# Altium footprint library USB_PD_PSU.PcbLib: 47 footprints (part 3 of 3)
Each footprint in its own frame and in the unit in brackets; x right, y up, seen from the top. Pads: shape width x height; smd on the part's side, far side on the other; paste and mask are expansions set on the pad; w line width, h text height; cw(c..) or ccw(c..) is an arc to the next point about the centre after c.
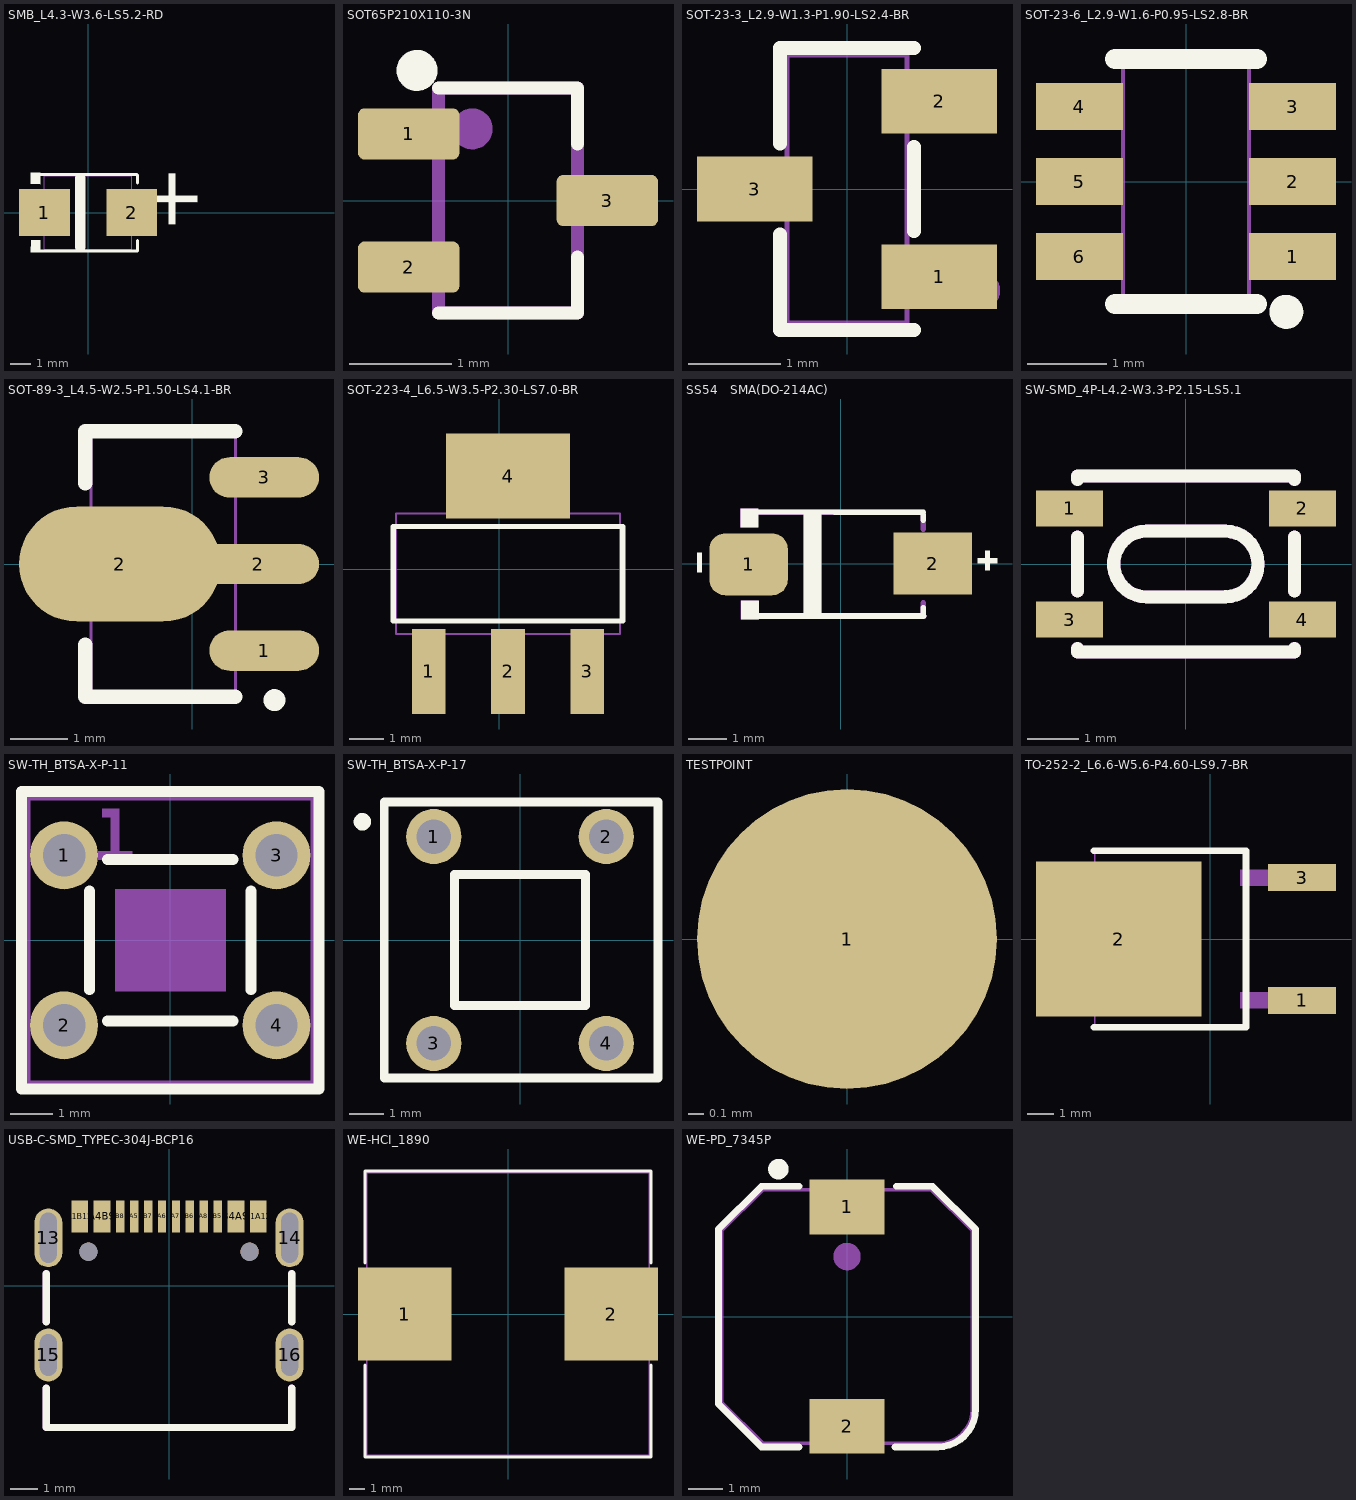
[diagram p2: the footprints below, top view; thin cyan lines are the x and y axes]

## SMB_L4.3-W3.6-LS5.2-RD [mm]
pads (2):
  rect 2.5x2.3 smd: 1(-2.15,0) 2(2.15,0)
Top Overlay:
  region: -2.357,-1.962 -2.344,-1.37 -2.804,-1.364 -2.814,-1.962
  region: -2.353,1.949 -2.365,1.399 -2.81,1.405 -2.81,1.949
  lines w0.152: -2.744,-1.886 2.433,-1.88 ; -2.744,1.886 2.413,1.88 ; 2.424,-1.877 2.431,-1.381 ; 2.424,1.839 2.427,1.462
  lines w0.508: -0.381,-1.682 -0.381,1.683
  text "+" at 6.36,-1.016 h5
  text "-" at -2.846,-0.721 h5
Top Assembly:
  region: 1.457,1.042 2.597,1.042 2.597,-1.042 1.457,-1.042
  region: -1.461,-1.042 -2.601,-1.042 -2.601,1.042 -1.461,1.042
  lines w0.051: -2.158,-1.81 2.158,-1.81 2.158,1.81 -2.158,1.81 -2.158,-1.81
  text ".Designator" at -2.413,2.221 h1
Mechanical 6:
  region: 2.487,-0.98 2.487,0.83 2.216,0.83 2.216,-0.98
  region: 2.895,-0.108 2.895,0.164 1.809,0.164 1.809,-0.108
  region: -2.801,-0.126 -2.801,0.145 -1.715,0.145 -1.715,-0.126
Mechanical 15:
  region: -2.587,-1.81 -2.587,-1.835 -2.623,-1.87 -2.672,-1.87 -2.707,-1.835 -2.707,-1.81 -2.707,-1.785 -2.672,-1.75 -2.623,-1.75 -2.587,-1.785 -2.587,-1.81
3D body "SMB (DO-214AA).STEP": height 2.5, standoff 0, extent -2.827,-1.95 2.573,1.95

## SOT65P210X110-3N [mm]
pads (3):
  rrect25% 0.99x0.5 smd: 1(-0.97,0.65) 2(-0.97,-0.65) 3(0.97,0)
Top Overlay:
  circle w0.2: c-0.889,1.27 r0.1
  lines w0.127: -0.68,-1.1 0.68,-1.1 0.68,-0.55 ; -0.68,1.1 0.68,1.1 0.68,0.55
Top Assembly:
  circle w0.2: c-0.35,0.7 r0.1
  lines w0.127: -0.68,-1.1 0.68,-1.1 0.68,1.1 -0.68,1.1 -0.68,-1.1
3D body "step_temp.STEP": height 1.1, standoff 0, extent -1.05,-1 1.05,1

## SOT-23-3_L2.9-W1.3-P1.90-LS2.4-BR [mm]
pads (3):
  rect 1.25x0.7 smd: 1(1,-0.95) 2(1,0.95) 3(-1,0)
Top Overlay:
  lines w0.152: -0.726,-0.495 -0.726,-1.526 0.726,-1.526 ; -0.726,0.495 -0.726,1.526 0.726,1.526 ; 0.726,-0.455 0.726,0.455
Top Assembly:
  region: 0.64,0.735 0.64,1.165 0.91,1.165 0.91,0.735
  region: -0.91,-0.215 -0.91,0.215 -0.64,0.215 -0.64,-0.215
  region: -1.2,-0.215 -1.2,0.215 -0.9,0.215 -0.9,-0.215
  region: 0.64,-1.165 0.64,-0.735 0.91,-0.735 0.91,-1.165
  region: 0.9,0.735 0.9,1.165 1.2,1.165 1.2,0.735
  region: 0.9,-1.165 0.9,-0.735 1.2,-0.735 1.2,-1.165
  lines w0.051: -0.65,-1.45 -0.65,1.45 0.65,1.45 0.65,-1.45 -0.65,-1.45
  text ".Designator" at 0.171,-1.02 h0.5
Mechanical 6:
  circle w0.2: c1.46,-1.1 r0.1
3D body "SOT23-3.step": height 1.1, standoff 0, extent -1.25,-1.499 1.25,1.499

## SOT-23-6_L2.9-W1.6-P0.95-LS2.8-BR [mm]
pads (6):
  rect 1.1x0.6 smd paste+0 mask+0.051: 1(1.35,-0.95) 2(1.35,0) 3(1.35,0.95) 4(-1.35,0.95) 5(-1.35,0) 6(-1.35,-0.95)
Top Overlay:
  circle w0.254: c1.27,-1.651 r0.089
  lines w0.254: -0.9,-1.55 0.9,-1.55 ; -0.9,1.55 0.9,1.55
Top Assembly:
  region: 1.33,-1.584 1.33,-1.609 1.295,-1.644 1.245,-1.644 1.21,-1.609 1.21,-1.584 1.21,-1.559 1.245,-1.524 1.295,-1.524 1.33,-1.559 1.33,-1.584
  region: -0.935,0.735 -0.935,1.165 -0.79,1.165 -0.79,0.735
  region: -0.935,-1.165 -0.935,-0.735 -0.79,-0.735 -0.79,-1.165
  region: 0.935,-0.735 0.935,-1.165 0.79,-1.165 0.79,-0.735
  region: 0.925,0.735 0.925,1.165 1.4,1.165 1.4,0.735
  region: 0.925,-0.215 0.925,0.215 1.4,0.215 1.4,-0.215
  region: 0.935,0.215 0.935,-0.215 0.79,-0.215 0.79,0.215
  region: -0.925,-1.165 -0.925,-0.735 -1.4,-0.735 -1.4,-1.165
  region: 0.935,1.165 0.935,0.735 0.79,0.735 0.79,1.165
  region: -0.925,-0.215 -0.925,0.215 -1.4,0.215 -1.4,-0.215
  region: 0.925,-1.165 0.925,-0.735 1.4,-0.735 1.4,-1.165
  region: -0.935,-0.215 -0.935,0.215 -0.79,0.215 -0.79,-0.215
  region: -0.925,0.735 -0.925,1.165 -1.4,1.165 -1.4,0.735
  lines w0.051: -0.8,-1.45 0.8,-1.45 0.8,1.45 -0.8,1.45 -0.8,-1.45
  text ".Designator" at 0.16,-1.27 h0.5
Mechanical 6:
  circle w0.2: c1.4,-0.95 r0.1
3D body "User Library-TSOT-23-6(S6).x_t": height 1, standoff 0, extent -1.412,-1.45 1.412,1.45

## SOT-89-3_L4.5-W2.5-P1.50-LS4.1-BR [mm]
pads (4):
  oval 1.9x0.7 smd paste-100 mask+0.051: 1(1.25,-1.501) 3(1.25,1.501)
  oval 3.5x2 smd paste-100 mask+0.051: 2(-1.25,0)
  oval 2.1x0.7 smd paste-100 mask+0.051: 2(1.151,0)
Top Overlay:
  circle w0.254: c1.429,-2.36 r0.062
  lines w0.254: -1.85,-1.4 -1.85,-2.3 0.75,-2.3 ; -1.85,1.4 -1.85,2.3 0.75,2.3
Top Paste:
  drawing of 3 lines, arcs and shapes, not listed
Top Assembly:
  region: 1.524,-2.388 1.524,-2.413 1.489,-2.448 1.439,-2.448 1.404,-2.413 1.404,-2.388 1.404,-2.363 1.439,-2.328 1.489,-2.328 1.524,-2.363 1.524,-2.388
  region: 0.65,-1.294 0.65,-1.709 1.85,-1.709 1.85,-1.294
  region: 0.65,1.709 0.65,1.294 1.85,1.294 1.85,1.709
  region: 0.551,0.233 0.551,-0.233 1.85,-0.233 1.85,0.233
  region: -1.949,-0.8 -2.25,-0.499 -2.247,0.5 -1.943,0.8 -0.024,0.8 0.551,0.23 0.551,-0.23 -0.126,-0.8
  lines w0.051: -1.75,-2.25 -1.75,2.25 0.75,2.25 0.75,-2.25 -1.75,-2.25
  text ".Designator" at -0.242,-2.195 h1
Mechanical 6:
  circle w0.254: c1.455,-1.575 r0.127
3D body "ams1117.step": height 1.52, standoff 0, extent -2.127,-2.25 1.873,2.25

## SOT-223-4_L6.5-W3.5-P2.30-LS7.0-BR [mm]
pads (4):
  rect 0.98x2.47 smd: 1(-2.046,-2.962) 2(0.254,-2.962) 3(2.554,-2.962)
  rect 3.6x2.47 smd: 4(0.254,2.708)
Top Overlay:
  lines w0.152: -3.072,-1.498 3.58,-1.498 3.58,1.244 -3.072,1.244 -3.072,-1.498
Top Assembly:
  region: -2.396,-1.867 -1.696,-1.867 -1.696,-2.687 -2.396,-2.687
  region: 2.204,-2.677 2.904,-2.677 2.904,-3.627 2.204,-3.627
  region: 2.204,-1.867 2.904,-1.867 2.904,-2.687 2.204,-2.687
  region: -1.246,2.423 1.754,2.423 1.754,3.373 -1.246,3.373
  region: -1.246,2.433 1.754,2.433 1.754,1.613 -1.246,1.613
  region: -0.096,-2.677 0.604,-2.677 0.604,-3.627 -0.096,-3.627
  region: -0.096,-1.867 0.604,-1.867 0.604,-2.687 -0.096,-2.687
  region: -2.396,-2.677 -1.696,-2.677 -1.696,-3.627 -2.396,-3.627
  lines w0.051: -2.996,-1.877 3.504,-1.877 3.504,1.623 -2.996,1.623 -2.996,-1.877
  text ".Designator" at -2.322,-0.393 h1
3D body "CircuitWorks-SOT-223.x_t": height 1.7, standoff 0.02, extent -2.996,-3.607 3.504,3.353

## SS54   SMA(DO-214AC) [mm]
pads (2):
  rrect50% 2.046x1.62 smd: 1(-2.404,-0.009)
  rect 2.046x1.62 smd: 2(2.404,0.009)
Top Overlay:
  region: -0.961,-1.397 -0.961,1.397 -0.508,1.397 -0.508,-1.397
  region: 3.773,-0.169 3.773,0.339 3.9,0.339 3.9,-0.169
  region: 3.575,0.143 4.083,0.143 4.083,0.016 3.575,0.016
  region: -3.752,-0.213 -3.752,0.295 -3.625,0.295 -3.625,-0.213
  region: -2.158,1.44 -2.158,0.962 -2.615,0.962 -2.615,1.44
  region: -2.145,-1.44 -2.145,-0.962 -2.602,-0.962 -2.602,-1.44
  lines w0.152: -2.526,1.364 2.159,1.346 ; -2.503,-1.364 2.165,-1.364 ; 2.159,-1.364 2.159,-1.143 ; 2.159,1.143 2.159,1.27
Top Assembly:
  region: -0.963,-1.402 -0.963,1.392 -0.51,1.392 -0.51,-1.402
  region: 1.846,0.227 2.354,0.227 2.354,0.1 1.846,0.1
  region: -2.8,-0.254 -2.8,0.254 -2.673,0.254 -2.673,-0.254
  region: -2.159,1.435 -2.159,0.958 -2.617,0.958 -2.617,1.435
  region: -2.147,-1.445 -2.147,-0.967 -2.604,-0.967 -2.604,-1.445
  region: 2.044,-0.085 2.044,0.423 2.171,0.423 2.171,-0.085
  region: -2.432,-0.097 -2.432,0.097 -1.659,0.097 -1.659,-0.097
  region: 2.432,-0.097 2.432,0.097 1.659,0.097 1.659,-0.097
  region: 2.142,-0.644 2.142,0.644 1.949,0.644 1.949,-0.644
  lines w0.152: -2.528,1.359 2.157,1.341 ; -2.505,-1.369 2.163,-1.369 ; 2.157,-1.369 2.157,-1.018 ; 2.157,0.915 2.157,1.265
  text "'.Designator'" at -0.762,-0.127 h0.5
3D body "SMA (DO-214AC).STEP": height 2.3, standoff 0, extent -2.854,-1.45 2.346,1.45

## SW-SMD_4P-L4.2-W3.3-P2.15-LS5.1 [mm]
pads (4):
  rect 1.3x0.7 smd paste+0 mask+0.051: 1(-2.25,1.075) 2(2.25,1.075) 3(-2.25,-1.075) 4(2.25,-1.075)
Top Overlay:
  lines w0.254: -2.1,-1.631 -2.1,-1.7 2.1,-1.7 2.1,-1.631 ; -2.1,-0.519 -2.1,0.519 ; -2.1,1.631 -2.1,1.7 2.1,1.7 2.1,1.631 ; -0.763,0.636 ccw(c-0.763,0) -0.762,-0.635 0.762,-0.635 ; -0.762,0.635 0.762,0.635 cw(c0.757,0) 0.761,-0.634 ; 2.1,-0.519 2.1,0.519
Top Assembly:
  lines w0.254: -2.1,-1.631 -2.1,-1.7 2.1,-1.7 2.1,-1.631 ; -2.1,-0.519 -2.1,0.519 ; -2.1,1.631 -2.1,1.7 2.1,1.7 2.1,1.631 ; -0.763,0.636 ccw(c-0.763,0) -0.762,-0.635 0.762,-0.635 ; -0.762,0.635 0.762,0.635 cw(c0.757,0) 0.761,-0.634 ; 2.1,-0.519 2.1,0.519
  text ".Designator" at -0.256,-0.016 h1
3D body "PTS810 SJM 250 SMTR LFS--3DModel-STEP-56544.STEP": height 2.7, standoff 0, extent -2.3,-1.6 2.3,1.6

## SW-TH_BTSA-X-P-11 [mm]
pads (4):
  round 1.6 hole 1: 1(-2.5,2) 2(-2.5,-2) 3(2.5,2) 4(2.5,-2)
Top Overlay:
  lines w0.254: -1.9,-1.162 -1.9,1.162 ; -1.474,-1.9 1.474,-1.9 ; -1.474,1.9 1.474,1.9 ; 1.9,-1.162 1.9,1.162 ; -3.5,-3.5 -3.5,3.5 3.5,3.5 3.5,-3.5 -3.5,-3.5
Top Assembly:
  region: -3.5,3.5 -3.5,-3.5 -3.3,-3.5 -3.3,3.5
  region: -3.3,3.5 3.5,3.5 3.5,-3.5 3.3,-3.5 3.3,3.3 -3.3,3.3
  region: -3.3,-3.5 3.3,-3.5 3.3,-3.3 -3.3,-3.3
  region: -1.4,3.1 -1.6,3.1 -1.6,2.9 -1.4,2.9
  region: -1.7,2.1 -0.9,2.1 -0.9,1.9 -1.7,1.9
  region: -1.4,3.1 -1.4,2.1 -1.2,2.1 -1.2,3.1
  region: -1.3,1.2 1.3,1.2 1.3,-1.2 -1.3,-1.2
Mechanical 15:
  region: 2.35,1.7 2.35,2.3 2.65,2.3 2.65,1.7
  region: 2.35,-2.3 2.35,-1.7 2.65,-1.7 2.65,-2.3
  region: -2.65,-2.3 -2.65,-1.7 -2.35,-1.7 -2.35,-2.3
  region: -2.65,1.7 -2.65,2.3 -2.35,2.3 -2.35,1.7
  region: -3.44,3.5 -3.44,3.475 -3.475,3.44 -3.525,3.44 -3.56,3.475 -3.56,3.5 -3.56,3.525 -3.525,3.56 -3.475,3.56 -3.44,3.525 -3.44,3.5
  lines w0.051: -3.5,-3.5 -3.5,3.5 3.5,3.5 3.5,-3.5 -3.5,-3.5
3D body "PVA1EEH1--3DModel-STEP-56544.STEP": height 17.84, standoff -3.4, extent -4.6,-4.773 4.6,5.027

## SW-TH_BTSA-X-P-17 [mm]
pads (4):
  round 1.6 hole 1: 1(-2.5,3) 2(2.5,3) 3(-2.5,-3) 4(2.5,-3)
Top Overlay:
  circle w0.254: c-4.572,3.429 r0.127
  lines w0.254: -3.937,-4 4,-4 4,4 -3.937,4 -3.937,-4 ; -1.9,-1.9 -1.9,1.9 1.9,1.9 1.9,-1.9 -1.9,-1.9
Top Assembly:
  region: -3.94,4 -3.94,3.975 -3.975,3.94 -4.025,3.94 -4.06,3.975 -4.06,4 -4.06,4.025 -4.025,4.06 -3.975,4.06 -3.94,4.025 -3.94,4
  lines w0.051: -4,-4 -4,4 4,4 4,-4 -4,-4
  text ".Designator" at -2.329,-0.173 h1
Mechanical 15:
  region: -2.2,-3.15 -2.8,-3.15 -2.8,-2.85 -2.2,-2.85
  region: 2.8,-3.15 2.2,-3.15 2.2,-2.85 2.8,-2.85
  region: 2.8,2.85 2.2,2.85 2.2,3.15 2.8,3.15
  region: -2.8,3.15 -2.2,3.15 -2.2,2.85 -2.8,2.85
3D body "PVA1EEH1--3DModel-STEP-56544.STEP": height 17.84, standoff -3.4, extent -4.9,-4.727 4.9,4.473

## TESTPOINT [mm]
pads (1):
  round 2 smd: 1(0,0)

## TO-252-2_L6.6-W5.6-P4.60-LS9.7-BR [mm]
pads (3):
  rect 2.54x1 smd: 1(3.427,-2.3) 3(3.427,2.3)
  rect 6.2x5.8 smd: 2(-3.427,0)
Top Overlay:
  lines w0.254: -4.365,-3.3 1.335,-3.3 1.335,3.3 -4.365,3.3
Top Assembly:
  region: 1.115,2.6 2.715,2.6 2.715,2 1.115,2
  region: 2.677,2.6 3.877,2.6 3.877,2 2.677,2
  region: 2.677,-2 3.877,-2 3.877,-2.6 2.677,-2.6
  region: -5.527,2.7 -0.812,2.7 -0.812,-2.7 -5.527,-2.7 -5.827,-2.413 -5.827,-1.505 -5.827,1.505 -5.827,2.413
  region: 1.115,-2 2.715,-2 2.715,-2.6 1.115,-2.6
  lines w0.051: -4.327,-3.3 1.273,-3.3 1.273,3.3 -4.327,3.3 -4.327,-3.3
  text ".Designator" at 0.7,-2.159 h1
Mechanical 6:
  circle w0.4: c4.235,-2.3 r0.2
3D body "FFSD1065B-F085.STEP": height 2.32, standoff 0, extent -6.075,-3.366 4.318,3.366

## USB-C-SMD_TYPEC-304J-BCP16 [mm]
pads (18):
  oval 1x2.1 hole 0.6 slot 1.8 at 90 deg paste-2539.97 mask+0.051: 13(-4.325,1.719) 14(4.325,1.719)
  oval 1x1.9 hole 0.6 slot 1.5 at 90 deg paste-2539.97 mask+0.051: 15(-4.325,-2.481) 16(4.325,-2.481)
  rect 0.6x1.15 smd mask+0.04: A1B12(-3.2,2.481) A4B9(-2.4,2.481) B1A12(3.2,2.481) B4A9(2.4,2.481)
  rect 0.3x1.15 smd mask+0.04: A5(-1.25,2.481) A6(-0.25,2.481) A7(0.25,2.481) A8(1.25,2.481) B5(1.75,2.481) B6(0.75,2.481) B7(-0.75,2.481) B8(-1.75,2.481)
  round 0.65 hole 0.65 unplated paste-2539.97: ""(-2.89,1.219) ""(2.89,1.219)
Top Overlay:
  lines w0.254: -4.4,-3.659 -4.4,-5.081 4.4,-5.081 4.4,-3.659 ; -4.4,-1.304 -4.4,0.441 ; 4.4,-1.304 4.4,0.441
Top Paste:
  region: -3.5,3.056 -2.9,3.056 -2.9,1.906 -3.5,1.906
  region: -2.7,3.056 -2.1,3.056 -2.1,1.906 -2.7,1.906
  region: -1.9,3.056 -1.6,3.056 -1.6,1.906 -1.9,1.906
  region: -1.4,3.056 -1.1,3.056 -1.1,1.906 -1.4,1.906
  region: -0.9,3.056 -0.6,3.056 -0.6,1.906 -0.9,1.906
  region: -0.4,3.056 -0.1,3.056 -0.1,1.906 -0.4,1.906
  region: 0.1,3.056 0.4,3.056 0.4,1.906 0.1,1.906
  region: 0.6,3.056 0.9,3.056 0.9,1.906 0.6,1.906
  region: 1.1,3.056 1.4,3.056 1.4,1.906 1.1,1.906
  region: 1.6,3.056 1.9,3.056 1.9,1.906 1.6,1.906
  region: 2.1,3.056 2.7,3.056 2.7,1.906 2.1,1.906
  region: 2.9,3.056 3.5,3.056 3.5,1.906 2.9,1.906
  region: -4.825,2.269 -4.825,2.368 -4.749,2.552 -4.608,2.692 -4.424,2.769 -4.226,2.769 -4.042,2.692 -3.901,2.552 -3.825,2.368 -3.825,2.269 -3.825,1.169 -3.825,1.069 -3.901,0.885 -4.042,0.745 -4.226,0.669 -4.424,0.669 -4.608,0.745 -4.749,0.885 -4.825,1.069 -4.825,1.169
  region: 3.825,2.269 3.825,2.368 3.901,2.552 4.042,2.692 4.226,2.769 4.424,2.769 4.608,2.692 4.749,2.552 4.825,2.368 4.825,2.269 4.825,1.169 4.825,1.069 4.749,0.885 4.608,0.745 4.424,0.669 4.226,0.669 4.042,0.745 3.901,0.885 3.825,1.069 3.825,1.169
  region: -4.825,-2.031 -4.825,-1.932 -4.749,-1.748 -4.608,-1.607 -4.424,-1.531 -4.226,-1.531 -4.042,-1.607 -3.901,-1.748 -3.825,-1.932 -3.825,-2.031 -3.825,-2.931 -3.825,-3.031 -3.901,-3.215 -4.042,-3.355 -4.226,-3.431 -4.424,-3.431 -4.608,-3.355 -4.749,-3.215 -4.825,-3.031 -4.825,-2.931
  region: 3.825,-2.031 3.825,-1.932 3.901,-1.748 4.042,-1.607 4.226,-1.531 4.424,-1.531 4.608,-1.607 4.749,-1.748 4.825,-1.932 4.825,-2.031 4.825,-2.931 4.825,-3.031 4.749,-3.215 4.608,-3.355 4.424,-3.431 4.226,-3.431 4.042,-3.355 3.901,-3.215 3.825,-3.031 3.825,-2.931
Top Assembly:
  lines w0.254: -4.4,-3.659 -4.4,-5.081 4.4,-5.081 4.4,-3.659 ; -4.4,-1.304 -4.4,0.441 ; 4.4,-1.304 4.4,0.441
  text ".Designator" at -0.26,0.018 h1
Mechanical 15:
  circle w0.3: c-2.89,1.219 r0.15
  circle w0.3: c2.89,1.219 r0.15
3D body "10155435-00011LF--3DModel-STEP-510211.STEP": height 0.5, standoff -3.66, extent -4.47,-5.058 4.47,2.54

## WE-HCI_1890 [mm]
pads (2):
  rect 6x6 smd: 1(-6.65,0) 2(6.65,0)
Top Overlay:
  lines w0.2: -9.2,-3.3 -9.2,-9.2 9.2,-9.2 9.2,-3.3 ; -9.2,3.3 -9.2,9.2 9.2,9.2 9.2,3.3
Top Assembly:
  lines w0.1: -9.1,-9.1 9.1,-9.1 9.1,9.1 -9.1,9.1 -9.1,-9.1
  text ".Designator" at -2.667,-0.192 h1
3D body "WE-HCI_1890_7443556+%28rev1%29.stp": height 8.95, standoff 0.05, extent -9.277,-9.1 9.023,9.1

## WE-PD_7345P [mm]
pads (2):
  rect 2.2x1.6 smd: 1(0,3.2) 2(0,-3.2)
Top Overlay:
  circle w0.3: c-2,4.3 r0.15
  lines w0.2: -1.4,-3.8 -2.5,-3.8 -3.75,-2.55 -3.75,2.55 -2.5,3.8 -1.4,3.8 ; 1.4,-3.8 2.65,-3.8 ccw(c2.65,-2.7) 3.75,-2.7 3.75,2.55 2.5,3.8 1.44,3.8
Top Assembly:
  circle w0.4: c0,1.75 r0.2
  lines w0.1: -3.65,-2.5 -3.65,2.5 -2.45,3.7 2.45,3.7 3.65,2.5 3.65,-2.7 cw(c2.65,-2.7) 2.65,-3.7 -2.45,-3.7 -3.65,-2.5
  text ".Designator" at -2.399,-0.265 h1
3D body "Download_WE-PD_7345P_STP+%28rev1%29.stp": height 4.22, standoff 0, extent -3.65,-3.523 3.65,3.777